# Altium footprint library clock.PcbLib: 34 footprints (part 3 of 3)
Each footprint in its own frame and in the unit in brackets; x right, y up, seen from the top. Pads: shape width x height; smd on the part's side, far side on the other; paste and mask are expansions set on the pad; w line width, h text height; cw(c..) or ccw(c..) is an arc to the next point about the centre after c.
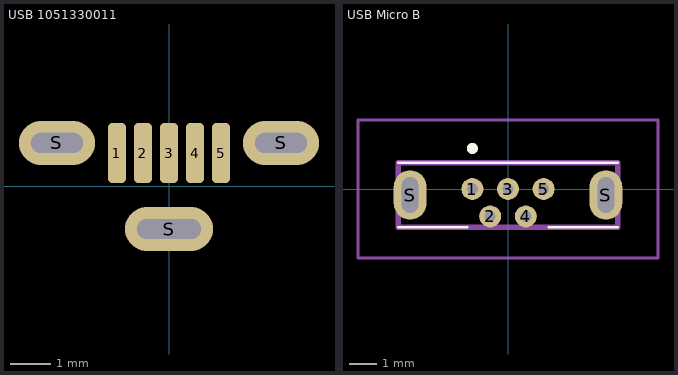
[diagram p2: the footprints below, top view; thin cyan lines are the x and y axes]

## USB 1051330011 [mm] "USB Micro B Right Angle SMT 1051330011"
height 6.7
pads (8):
  rrect50% 0.45x1.5 smd mask+0.04: 1(-1.3,0.825) 2(-0.65,0.825) 3(0,0.825) 4(0.65,0.825) 5(1.3,0.825)
  oval 1.9x1.1 hole 0.5 slot 1.3 at 0 deg: S(-2.8,1.075) S(2.8,1.075)
  oval 2.2x1.1 hole 0.5 slot 1.6 at 0 deg: S(0,-1.075)
3D body "usb_connector v8.step": height 6.71, standoff -2.3, extent -4.025,-1.56 3.975,1.455

## USB Micro B [mm]
pads (7):
  round 0.8 hole 0.4 mask+0.076: 1(-1.3,0) 2(-0.65,-1) 3(0,0) 4(0.65,-1) 5(1.3,0)
  oval 1.2x1.8 hole 0.6 slot 1.3 at 90 deg: S(-3.575,-0.22) S(3.575,-0.22)
Top Overlay:
  lines w0.1: -4,-1.395 -1.5,-1.395 ; -4,0.955 4,0.955 ; 1.5,-1.395 4,-1.395
  lines w0.2: -1.4,1.48 ccw(c-1.3,1.48) -1.2,1.48 ccw(c-1.3,1.48) -1.4,1.48
Mechanical 15:
  lines w0.2: -4,-1.395 4,-1.395 4,0.955 -4,0.955 -4,-1.395
Mechanical 20:
  lines w0.1: -5.475,-2.515 5.475,-2.515 5.475,2.515 -5.475,2.515 -5.475,-2.515